# Altium integrated library Self made library.IntLib: 370 symbols (part 1 of 3) (continued)
## APF27_OK (continued)
part C pins: MH_1 MH
part D pins: MH_2 MH
part E pins: MH_3 MH
part F pins: MH_4 MH

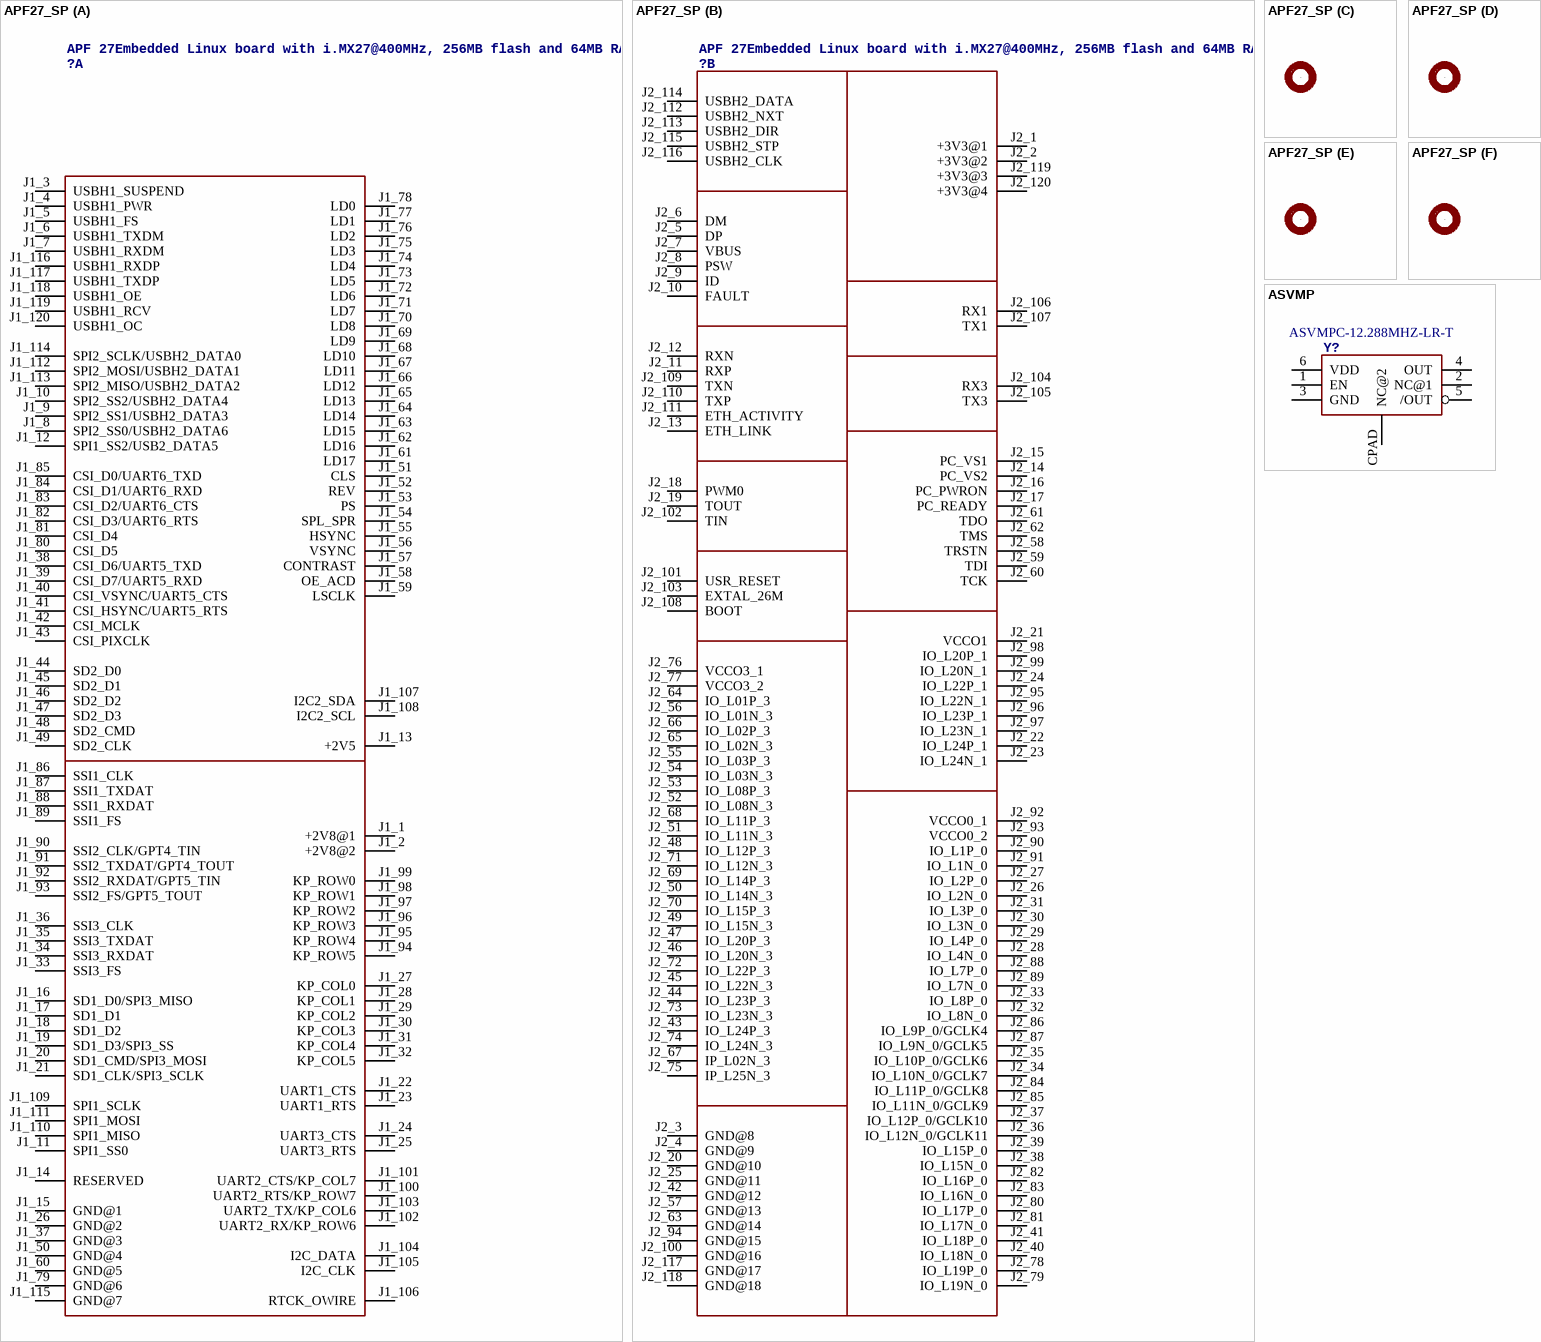
[diagram p4: symbols APF27_SP to ASVMP]

## APF27_SP
designator ?, comment APF 27Embedded Linux board with i.MX27@400MHz, 256MB flash and 64MB RAM
footprint APF27_SPECIAL_FOR_ADAPTER
part A pins: J1_1 +2V8@1, J1_2 +2V8@2, J1_3 USBH1_SUSPEND, J1_4 USBH1_PWR, J1_5 USBH1_FS, J1_6 USBH1_TXDM, J1_7 USBH1_RXDM, J1_8 SPI2_SS0/USBH2_DATA6, J1_9 SPI2_SS1/USBH2_DATA3, J1_10 SPI2_SS2/USBH2_DATA4, J1_11 SPI1_SS0, J1_12 SPI1_SS2/USB2_DATA5, J1_13 +2V5, J1_14 RESERVED, J1_15 GND@1, J1_16 SD1_D0/SPI3_MISO, J1_17 SD1_D1, J1_18 SD1_D2, J1_19 SD1_D3/SPI3_SS, J1_20 SD1_CMD/SPI3_MOSI, J1_21 SD1_CLK/SPI3_SCLK, J1_22 UART1_CTS, J1_23 UART1_RTS, J1_24 UART3_CTS, J1_25 UART3_RTS, J1_26 GND@2, J1_27 KP_COL0, J1_28 KP_COL1, J1_29 KP_COL2, J1_30 KP_COL3, J1_31 KP_COL4, J1_32 KP_COL5, J1_33 SSI3_FS, J1_34 SSI3_RXDAT, J1_35 SSI3_TXDAT, J1_36 SSI3_CLK, J1_37 GND@3, J1_38 CSI_D6/UART5_TXD, J1_39 CSI_D7/UART5_RXD, J1_40 CSI_VSYNC/UART5_CTS, J1_41 CSI_HSYNC/UART5_RTS, J1_42 CSI_MCLK, J1_43 CSI_PIXCLK, J1_44 SD2_D0, J1_45 SD2_D1, J1_46 SD2_D2, J1_47 SD2_D3, J1_48 SD2_CMD, J1_49 SD2_CLK, J1_50 GND@4, J1_51 CLS, J1_52 REV, J1_53 PS, J1_54 SPL_SPR, J1_55 HSYNC, J1_56 VSYNC, J1_57 CONTRAST, J1_58 OE_ACD, J1_59 LSCLK, J1_60 GND@5, J1_61 LD17, J1_62 LD16, J1_63 LD15, J1_64 LD14, J1_65 LD13, J1_66 LD12, J1_67 LD11, J1_68 LD10, J1_69 LD9, J1_70 LD8, J1_71 LD7, J1_72 LD6, J1_73 LD5, J1_74 LD4, J1_75 LD3, J1_76 LD2, J1_77 LD1, J1_78 LD0, J1_79 GND@6, J1_80 CSI_D5, J1_81 CSI_D4, J1_82 CSI_D3/UART6_RTS, J1_83 CSI_D2/UART6_CTS, J1_84 CSI_D1/UART6_RXD, J1_85 CSI_D0/UART6_TXD, J1_86 SSI1_CLK, J1_87 SSI1_TXDAT, J1_88 SSI1_RXDAT, J1_89 SSI1_FS, J1_90 SSI2_CLK/GPT4_TIN, J1_91 SSI2_TXDAT/GPT4_TOUT, J1_92 SSI2_RXDAT/GPT5_TIN, J1_93 SSI2_FS/GPT5_TOUT, J1_94 KP_ROW5, J1_95 KP_ROW4, J1_96 KP_ROW3, J1_97 KP_ROW2, J1_98 KP_ROW1, J1_99 KP_ROW0, J1_100 UART2_RTS/KP_ROW7, J1_101 UART2_CTS/KP_COL7, J1_102 UART2_RX/KP_ROW6, J1_103 UART2_TX/KP_COL6, J1_104 I2C_DATA, J1_105 I2C_CLK, J1_106 RTCK_OWIRE, J1_107 I2C2_SDA, J1_108 I2C2_SCL, J1_109 SPI1_SCLK, J1_110 SPI1_MISO, J1_111 SPI1_MOSI, J1_112 SPI2_MOSI/USBH2_DATA1, J1_113 SPI2_MISO/USBH2_DATA2, J1_114 SPI2_SCLK/USBH2_DATA0, J1_115 GND@7, J1_116 USBH1_RXDP, J1_117 USBH1_TXDP, J1_118 USBH1_OE, J1_119 USBH1_RCV, J1_120 USBH1_OC
part B pins: J2_1 +3V3@1, J2_2 +3V3@2, J2_3 GND@8, J2_4 GND@9, J2_5 DP, J2_6 DM, J2_7 VBUS, J2_8 PSW, J2_9 ID, J2_10 FAULT, J2_11 RXP, J2_12 RXN, J2_13 ETH_LINK, J2_14 PC_VS2, J2_15 PC_VS1, J2_16 PC_PWRON, J2_17 PC_READY, J2_18 PWM0, J2_19 TOUT, J2_20 GND@10, J2_21 VCCO1, J2_22 IO_L24P_1, J2_23 IO_L24N_1, J2_24 IO_L22P_1, J2_25 GND@11, J2_26 IO_L2N_0, J2_27 IO_L2P_0, J2_28 IO_L4N_0, J2_29 IO_L4P_0, J2_30 IO_L3N_0, J2_31 IO_L3P_0, J2_32 IO_L8N_0, J2_33 IO_L8P_0, J2_34 IO_L10N_0/GCLK7, J2_35 IO_L10P_0/GCLK6, J2_36 IO_L12N_0/GCLK11, J2_37 IO_L12P_0/GCLK10, J2_38 IO_L15N_0, J2_39 IO_L15P_0, J2_40 IO_L18N_0, J2_41 IO_L18P_0, J2_42 GND@12, J2_43 IO_L24P_3, J2_44 IO_L23P_3, J2_45 IO_L22N_3, J2_46 IO_L20N_3, J2_47 IO_L20P_3, J2_48 IO_L12P_3, J2_49 IO_L15N_3, J2_50 IO_L14N_3, J2_51 IO_L11N_3, J2_52 IO_L08N_3, J2_53 IO_L08P_3, J2_54 IO_L03N_3, J2_55 IO_L03P_3, J2_56 IO_L01N_3, J2_57 GND@13, J2_58 TRSTN, J2_59 TDI, J2_60 TCK, J2_61 TDO, J2_62 TMS, J2_63 GND@14, J2_64 IO_L01P_3, J2_65 IO_L02N_3, J2_66 IO_L02P_3, J2_67 IP_L02N_3, J2_68 IO_L11P_3, J2_69 IO_L14P_3, J2_70 IO_L15P_3, J2_71 IO_L12N_3, J2_72 IO_L22P_3, J2_73 IO_L23N_3, J2_74 IO_L24N_3, J2_75 IP_L25N_3, J2_76 VCCO3_1, J2_77 VCCO3_2, J2_78 IO_L19P_0, J2_79 IO_L19N_0, J2_80 IO_L17P_0, J2_81 IO_L17N_0, J2_82 IO_L16P_0, J2_83 IO_L16N_0, J2_84 IO_L11P_0/GCLK8, J2_85 IO_L11N_0/GCLK9, J2_86 IO_L9P_0/GCLK4, J2_87 IO_L9N_0/GCLK5, J2_88 IO_L7P_0, J2_89 IO_L7N_0, J2_90 IO_L1P_0, J2_91 IO_L1N_0, J2_92 VCCO0_1, J2_93 VCCO0_2, J2_94 GND@15, J2_95 IO_L22N_1, J2_96 IO_L23P_1, J2_97 IO_L23N_1, J2_98 IO_L20P_1, J2_99 IO_L20N_1, J2_100 GND@16, J2_101 USR_RESET, J2_102 TIN, J2_103 EXTAL_26M, J2_104 RX3, J2_105 TX3, J2_106 RX1, J2_107 TX1, J2_108 BOOT, J2_109 TXN, J2_110 TXP, J2_111 ETH_ACTIVITY, J2_112 USBH2_NXT, J2_113 USBH2_DIR, J2_114 USBH2_DATA, J2_115 USBH2_STP, J2_116 USBH2_CLK, J2_117 GND@17, J2_118 GND@18, J2_119 +3V3@3, J2_120 +3V3@4
part C pins: MH_1 MH
part D pins: MH_2 MH
part E pins: MH_3 MH
part F pins: MH_4 MH

## ASVMP
designator Y?, comment Manufacturer Part Number 1: ASVMPC-12.288MHZ-LR-T  (hidden comment: ABRACON - ASVMP Serie Oscillator   PERFORMANCE PLASTIC PACKAGE ULTRA MINIATURE PURE SILICONTM CLOCK OSCILLATOR)
UNIT_PRICE: 1.43; Description 1: Oscillateurs d'horloge standard 12.288MHz CMOS MEMS 25ppm -40C +85C; Fréquence: 12.288 MHz; Stabilité de fréquence: 25 PPM; Package/Boîte: 7 mm x 5 mm; Conditionnement: Reel; Produit: MEMS Oscillators; Tension d'alimentation: 2.25 V to 3.6 V; Style du raccordement: SMD/SMT; Température de fonctionnement max.: + 85 C; Température de fonctionnement min.: - 40 C; Format de sortie: CMOS; Quantité standard du lot: 1000; MANUFACTURER: ABRACON; MANUFACTURER_PART_NUMBER: ASVMPC-12.288MHZ-LR-T; SUPPLIER: Digikey; SUPPLIER_PART_NUMBER: 535-11178-6-ND; Supplier 1: Mouser; Supplier Part Number 1: 815-ASVMPC-12.28LR-T; Manufacturer 1: ABRACON; RoHS: RoHS Compliant; Category: Oscillateurs d'horloge standard; Stock 1: 0; Pricing 1: 1000=1.25, 2000=1.13, 5000=1.06, 10000=1.03 (CHF); Série: ASVMP; Marque: ABRACON; Style de montage: SMD/SMT; Fabricant: ABRACON; RoHS - Mouser: Y; Minimum Order Quantity: 1000; Reeling: True; ComponentLink1URL: http://www.mouser.com/ds/2/3/ASVMP-44479.pdf; ComponentLink1Description: http://www.mouser.com/ds/2/3/ASVMP-44479.pdf
footprint ASVMP
pins: 1 EN, 2 NC@1, 3 GND, 4 OUT, 5 /OUT, 6 VDD, CPAD NC@2

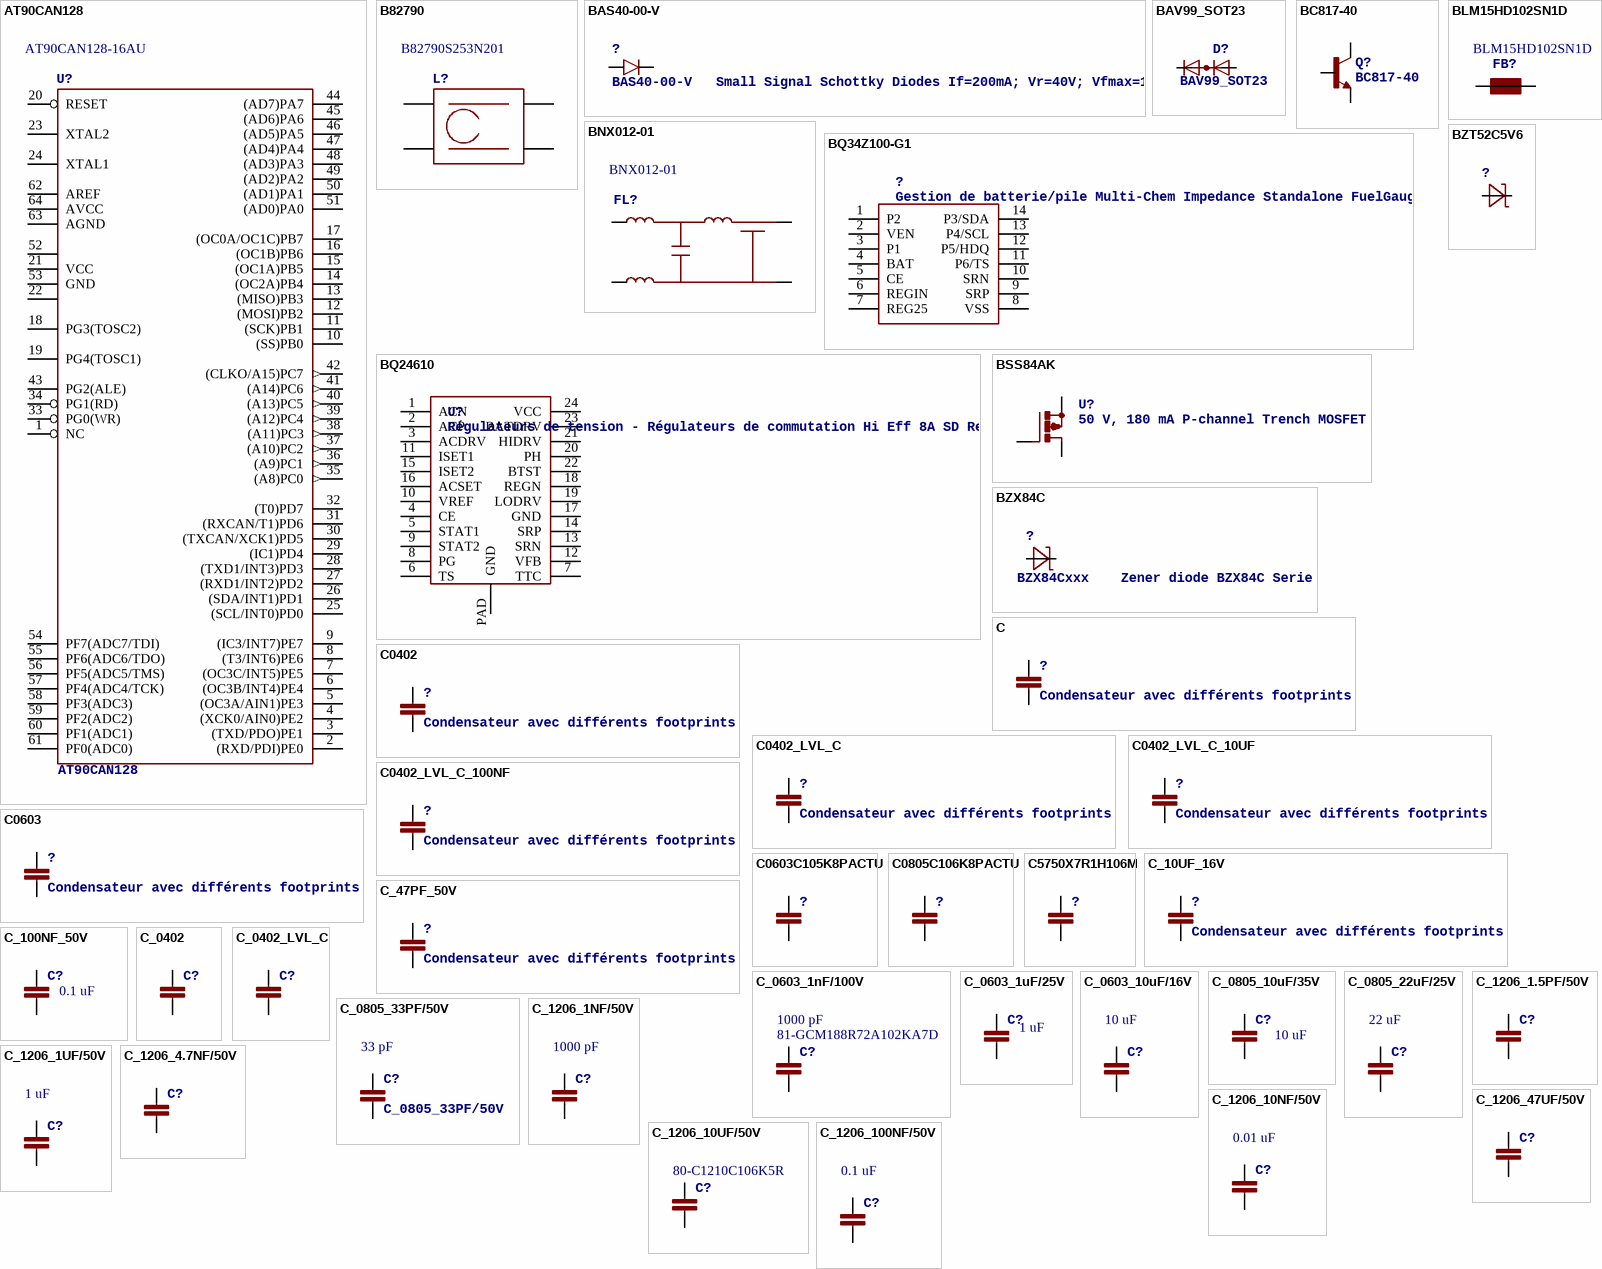
[diagram p5: symbols AT90CAN128 to C_1206_100NF/50V]

## AT90CAN128
designator U?  Manufacturer Part Number: AT90CAN128-16AU
8-bit Microcontroller with 128K Bytes of ISP Flash and CAN Controller; Manufacturer: Atmel; Data RAM Size: 4 kB; Interface Type: JTAG, SPI, TWI, USART; Number of I/Os: 53 I/O; Program Memory Size: 128 kB; Core: AVR; Data Bus Width: 8 bit; Maximum Clock Frequency: 16 MHz; Operating Supply Voltage: 2.7 V to 5.5 V; Processor Series: AT90CANx; Supply Voltage - Max: 5.5 V; Supply Voltage - Min: 2.7 V; Digger CMP: CMP3575; Supplier 1: Mouser; RoHS: RoHS Compliant; Category: 8-bit Microcontrollers - MCU; Stock 1: 5242; Pricing 1: 1=9.68, 10=8.81, 25=8.15, 50=7.80, 100=7.49, 250=6.83, 500=6.38, 1000=6.25 (CHF); Package/Case: TQFP-64; Program Memory Type: Flash; Series: AT90CAN128; Brand: Atmel; Mounting Style: SMD/SMT; Maximum Operating Temperature: + 85 C; Minimum Operating Temperature: - 40 C; Product Category: Microcontrollers - RISC; Standard Pack Qty: 450; RoHS - Mouser: Y; Minimum Order Quantity: 1; Reeling: False; ComponentLink1URL: http://www.mouser.com/ds/2/36/doc7679-50087.pdf; ComponentLink1Description: http://www.mouser.com/ds/2/36/doc7679-50087.pdf; Supplier Part Number 1: 556-A90CAN128-16AU
footprint TQFP64 (QFP, 64-Leads, Body 16,00x16,00mm, Pitch 0,8mm, IPC Medium Density)
pins: 1 NC, 2 (RXD/PDI)PE0, 3 (TXD/PDO)PE1, 4 (XCK0/AIN0)PE2, 5 (OC3A/AIN1)PE3, 6 (OC3B/INT4)PE4, 7 (OC3C/INT5)PE5, 8 (T3/INT6)PE6, 9 (IC3/INT7)PE7, 10 (SS)PB0, 11 (SCK)PB1, 12 (MOSI)PB2, 13 (MISO)PB3, 14 (OC2A)PB4, 15 (OC1A)PB5, 16 (OC1B)PB6, 17 (OC0A/OC1C)PB7, 18 PG3(TOSC2), 19 PG4(TOSC1), 20 RESET, 21 VCC (power), 22 GND1 (power), 23 XTAL2, 24 XTAL1, 25 (SCL/INT0)PD0, 26 (SDA/INT1)PD1, 27 (RXD1/INT2)PD2, 28 (TXD1/INT3)PD3, 29 (IC1)PD4, 30 (TXCAN/XCK1)PD5, 31 (RXCAN/T1)PD6, 32 (T0)PD7, 33 PG0(WR), 34 PG1(RD), 35 (A8)PC0 (out), 36 (A9)PC1 (out), 37 (A10)PC2 (out), 38 (A11)PC3 (out), 39 (A12)PC4 (out), 40 (A13)PC5 (out), 41 (A14)PC6 (out), 42 (CLKO/A15)PC7 (out), 43 PG2(ALE), 44 (AD7)PA7, 45 (AD6)PA6, 46 (AD5)PA5, 47 (AD4)PA4, 48 (AD3)PA3, 49 (AD2)PA2, 50 (AD1)PA1, 51 (AD0)PA0, 52 VCC1 (power), 53 GND (power), 54 PF7(ADC7/TDI), 55 PF6(ADC6/TDO), 56 PF5(ADC5/TMS), 57 PF4(ADC4/TCK), 58 PF3(ADC3), 59 PF2(ADC2), 60 PF1(ADC1), 61 PF0(ADC0), 62 AREF, 63 AGND, 64 AVCC

## B82790
designator L?  Manufacturer Part Number: B82790S253N201  (hidden comment: B82790)
Chokes for Data and Signal Lines; Manufacturer: EPCOS / TDK; Core Material: Ferrite; Inductance: 25 mH; Maximum DC Current: 500 mA; Maximum DC Resistance: 110 mOhms; Tolerance: 30 %; Type: Common Mode Choke, Ring Core; Case Height: 4.9 mm; Case Length: 9 mm; Case Width: 6 mm; Digger CMP: CMP3571; Supplier 1: Mouser; RoHS: RoHS Compliant; Category: Common Mode Filters / Chokes; Stock 1: 1398; Pricing 1: 1=3.66, 10=3.41, 100=2.42, 250=2.31, 500=2.21, 1000=1.59, 1500=1.59, 3000=1.55 (CHF); Packaging: Reel; Product: Chokes; Series: B82790S0; Termination Style: SMD/SMT; Brand: EPCOS / TDK; Standard Pack Qty: 1500; RoHS - Mouser: Y; Minimum Order Quantity: 1; Reeling: True; ComponentLink1URL: http://www.mouser.com/ds/2/400/b82790c0_s0-525376.pdf; ComponentLink1Description: http://www.mouser.com/ds/2/400/b82790c0_s0-525376.pdf; Supplier Part Number 1: 871-B82790S253N201
footprint B82790
pins: 1, 2, 3, 4

## BAS40-00-V
designator ?, comment BAS40-00-V   Small Signal Schottky Diodes If=200mA; Vr=40V; Vfmax=1V
footprint SOT23
pins: 1 A, 3 C

## BAV99_SOT23
designator D?
Manufacturer: Fairchild Semiconductor; Manufacturer Part Number: BAV99; Configuration: Dual Series; Forward Continuous Current: 0.2 A; Max Surge Current: 2 A; Recovery Time: 6 ns; Forward Voltage Drop: 1.25 V at 0.15 A; Digger CMP: CMP2481; Supplier 1: Mouser; RoHS: RoHS Compliant; Category: Diodes - General Purpose, Power, Switching; Stock 1: 119067; Pricing 1: 1=0.214, 10=0.145, 100=0.060, 1000=0.036, 3000=0.032, 9000=0.026, 24000=0.024, 45000=0.023, 99000=0.020 (CHF); Package/Case: SOT-23; Packaging: Reel; Series: BAV99; Brand: Fairchild Semiconductor; Mounting Style: SMD/SMT; Maximum Operating Temperature: + 150 C; Minimum Operating Temperature: - 55 C; Standard Pack Qty: 3000; RoHS - Mouser: Y; Minimum Order Quantity: 1; Reeling: True; ComponentLink1URL: http://www.mouser.com/ds/2/149/BAV99-22788.pdf; ComponentLink1Description: http://www.mouser.com/ds/2/149/BAV99-22788.pdf; Supplier Part Number 1: 512-BAV99
footprint SOT23
pins: 1 A, 2 C, 3 AC

## BC817-40
designator Q?
SMD npn small transistor; Manufacturer: Infineon Technologies; Manufacturer Part Number: BC 817K-40 E6327; Collector- Base Voltage VCBO: 50 V; Collector- Emitter Voltage VCEO Max: 45 V; Configuration: Single; Emitter- Base Voltage VEBO: 5 V; DC Collector/Base Gain hFE Min: 250; Gain Bandwidth Product fT: 170 MHz; Maximum DC Collector Current: 0.5 A; Maximum Power Dissipation: 500 mW; Digger CMP: CMP3884; Supplier 1: Mouser; RoHS: RoHS Compliant; Category: Bipolar Transistors - BJT; Stock 1: 125907; Pricing 1: 1=0.218, 10=0.189, 100=0.066, 1000=0.046, 3000=0.034, 9000=0.029, 24000=0.027, 45000=0.024, 99000=0.020 (CHF); Package/Case: SOT-23; Packaging: Reel; Series: BC 817K; Brand: Infineon Technologies; Mounting Style: SMD/SMT; Transistor Polarity: NPN; Maximum Operating Temperature: + 150 C; Minimum Operating Temperature: - 65 C; Product Category: General Purpose Transistors; Standard Pack Qty: 3000; RoHS - Mouser: Y; Minimum Order Quantity: 1; Reeling: True; ComponentLink1URL: http://www.mouser.com/ds/2/196/bc817Kseries_bc818Kseries-85224.pdf; ComponentLink1Description: http://www.mouser.com/ds/2/196/bc817Kseries_bc818Kseries-85224.pdf; Supplier Part Number 1: 726-BC817K-40E6327
footprint SOT23
pins: 1 B, 2 E, 3 C

## BLM15HD102SN1D
designator FB?, comment Manufacturer Part Number 1: BLM15HD102SN1D  (hidden comment: EMI filter)
MANUFACTURER: Murata Electronics; UNIT_PRICE: 0.163; Description 1: Perles de filtres, composants et faisceaux EMI 0402 1Kohms Tape GHz Hi Spd Sig Line; Impédance: 1 kOhms; Courant CC max.: 250 mA; Résistance CC max.: 1.25 Ohms; Plage de températures de fonctionnement: - 55 C to + 125 C; Package/Boîte: 0402 (1005 metric); Conditionnement: Reel; Produit: Ferrite Chip Beads; Série: BLM; Style du raccordement: SMD/SMT; Tolérance: 25 %; Hauteur du boîtier: 0.5 mm; Longueur du boîtier: 1 mm; Fabricant: Murata; Catégorie du produit: SMD EMI Filters/Chip Ferrite Beads; Quantité standard du lot: 10000; Fréquence de test: 100 MHz; MANUFACTURER_PART_NUMBER: BLM15HD102SN1D; SUPPLIER: mouser; SUPPLIER_PART_NUMBER: 81-BLM15HD102SN1D; Supplier 1: Mouser; Supplier Part Number 1: 81-BLM15HD102SN1D; Manufacturer 1: Murata Electronics; RoHS: RoHS Compliant; Category: Perles de filtres, composants et faisceaux EMI; Stock 1: 71076; Pricing 1: 1=0.229, 10=0.125, 100=0.086, 500=0.077, 1000=0.064, 2500=0.055, 10000=0.053, 20000=0.050, 50000=0.048 (CHF); Capacité électrique: -; Dimensions: 0.5 mm W x 1 mm L x 0.5 mm H; Marque: Murata Electronics; Largeur du boîtier: 0.5 mm; RoHS - Mouser: Y; Minimum Order Quantity: 1; Reeling: True; ComponentLink1URL: http://search.murata.co.jp/Ceramy/CatalogAction.do?sHinnm=?&nbsp&sNHinnm=BLM15HD102SN1D&sNhin_key=BLM15HD102SN1D&sLang=en; ComponentLink1Description: http://search.murata.co.jp/Ceramy/CatalogAction.do?sHinnm=?&nbsp&sNHinnm=BLM15HD102SN1D&sNhin_key=BLM15HD102SN1D&sLang=en
footprint R0402
pins: 1, 2

## BNX012-01
designator FL?, comment Manufacturer Part Number: BNX012-01  (hidden comment: Murata: BNX0 Series   Power Filter Block Type EMIFILr (LC Combined)  SMD-Type)
Manufacturer: Murata Electronics; Current Rating: 15 A; Frequency Range: 1 MHz to 1 GHz; Voltage Rating: 50 V; Circuit Type: LC Filter; Case Height: 8 mm; Case Length: 12 mm; Case Width: 11 mm; Digger CMP: CMP4454; Supplier 1: Mouser; RoHS: RoHS Compliant; Category: EMI Network Filter; Stock 1: 2542; Pricing 1: 1=4.36, 10=2.86, 100=2.52, 250=2.34, 500=2.23, 1000=2.17 (CHF); Capacitance: -; Inductance: -; Operating Temperature Range: - 55 C to + 125 C; Packaging: Bulk; Product: EMI Network Filter Arrays; Resistance: -; Series: BNX; Termination Style: Radial; Type: Block Type EMI Filter LC Combined; Brand: Murata Electronics; Cutoff Frequency: -; Product Category: Through Hole Suppression Filters; Standard Pack Qty: 150; Tradename: EMIFIL; RoHS - Mouser: Y; Minimum Order Quantity: 1; Reeling: False; ComponentLink1URL: http://www.mouser.com/ds/2/281/Murata BNX Series-303196.pdf; ComponentLink1Description: http://www.mouser.com/ds/2/281/Murata BNX Series-303196.pdf; Supplier Part Number 1: 81-BNX012-01
footprint BNX012-01
pins: B, CB, CGa, CGb, CGc, PSG

## BQ34Z100-G1
designator ?, comment Gestion de batterie/pile Multi-Chem Impedance Standalone FuelGauge
MANUFACTURER: Texas Instruments; MANUFACTURER_PART_NUMBER: BQ34Z100PW-G1; UNIT_PRICE: 6.1; SUPPLIER: Mouser; SUPPLIER_PART_NUMBER: 595-BQ34Z100PW-G1
footprint R-PDSO-G14
pins: 1 P2, 2 VEN, 3 P1, 4 BAT, 5 CE, 6 REGIN, 7 REG25, 8 VSS, 9 SRP, 10 SRN, 11 P6/TS, 12 P5/HDQ, 13 P4/SCL, 14 P3/SDA

## BQ24610
designator U?, comment Régulateurs de tension - Régulateurs de commutation Hi Eff 8A SD Reg
footprint S-PWGFN-N24
pins: 1 ACN, 2 ACP, 3 ACDRV, 4 CE, 5 STAT1, 6 TS, 7 TTC, 8 PG, 9 STAT2, 10 VREF, 11 ISET1, 12 VFB, 13 SRN, 14 SRP, 15 ISET2, 16 ACSET, 17 GND, 18 REGN, 19 LODRV, 20 PH, 21 HIDRV, 22 BTST, 23 BATDRV, 24 VCC, PAD GND

## BSS84AK
designator U?, comment 50 V, 180 mA P-channel Trench MOSFET
MANUFACTURER: NXP Semiconductors; MANUFACTURER_PART_NUMBER: BSS84AK,215; UNIT_PRICE: 0.098; SUPPLIER: mouser; SUPPLIER_PART_NUMBER: 771-BSS84AK215
footprint TO236
pins: 1 G, 2 S, 3 D

## BZT52C5V6
designator ?
MANUFACTURER: Vishay Semiconductors; UNIT_PRICE: 0.088; SUPPLIER: mouser; SUPPLIER_PART_NUMBER: BZT52C5V6-E3-08
footprint SOD123
pins: A, C

## BZX84C
designator ?, comment BZX84Cxxx    Zener diode BZX84C Serie
footprint SOT23
pins: 1 A, 3 C

## C
designator ?, comment Condensateur avec différents footprints
footprint 0805
pins: 1, 2

## C0402
designator ?, comment Condensateur avec différents footprints
footprint C0402
pins: 1, 2

## C0402_LVL_C
designator ?, comment Condensateur avec différents footprints
footprint C0402_LVL_C
pins: 1, 2

## C0402_LVL_C_10UF
designator ?, comment Condensateur avec différents footprints
MANUFACTURER: Murata; MANUFACTURER_PART_NUMBER: GRM155R60J106ME44D; UNIT_PRICE: 0.315; SUPPLIER: Mouser; SUPPLIER_PART_NUMBER: 81-GRM155R60J106ME4D
footprint C0402_LVL_C
pins: 1, 2

## C0402_LVL_C_100NF
designator ?, comment Condensateur avec différents footprints
MANUFACTURER: Murata; MANUFACTURER_PART_NUMBER: GRM155R61H104KE14D; UNIT_PRICE: 0.115; SUPPLIER: Mouser; SUPPLIER_PART_NUMBER: 81-GRM155R61H104KE4D
footprint C0402_LVL_C
pins: 1, 2

## C0603
designator ?, comment Condensateur avec différents footprints
footprint 0603
pins: 1, 2

## C0603C105K8PACTU
designator ?
footprint R0603
pins: 1, 2

## C0805C106K8PACTU
designator ?
footprint 0805
pins: 1, 2

## C5750X7R1H106M
designator ?
footprint C2220K
pins: 1, 2

## C_10UF_16V
designator ?, comment Condensateur avec différents footprints
MANUFACTURER: Murata; MANUFACTURER_PART_NUMBER: GRM188R61C106MAALD; UNIT_PRICE: 0.344; SUPPLIER: Mouser; SUPPLIER_PART_NUMBER: 81-GRM188R61C106MALD
footprint 0603
pins: 1, 2

## C_47PF_50V
designator ?, comment Condensateur avec différents footprints
MANUFACTURER: Vishay; MANUFACTURER_PART_NUMBER: VJ0603A470JXACW1BC; UNIT_PRICE: 0.057; SUPPLIER: Mouser; SUPPLIER_PART_NUMBER: 77-VJ0603A470JXACBC
footprint 0603
pins: 1, 2

## C_100NF_50V
designator C?, comment Capacité électrique: 0.1 uF  (hidden comment: Condensateur avec différents footprints)
MANUFACTURER: Murata; MANUFACTURER_PART_NUMBER: GCM188R71H104KA57D; Manufacturer 1: Murata Electronics; UNIT_PRICE: 0.127; Description 1: Condensateurs céramique multicouches MLCC - CMS 0603 0.1uF 50volts X7R 10%; Plage de températures de fonctionnement: - 55 C to + 125 C; Package/Boîte: 0603 (1608 metric); Conditionnement: Reel; Produit: Automotive MLCCs; Série: GCM; Style du raccordement: SMD/SMT; Tolérance: 10 %; Type: Automotive Ultra Small MLCC; Tension de voltage CC: 50 V; Code de caisse - po: 0603; Code de caisse - mm: 1608; Hauteur du boîtier: 0.8 mm; Longueur du boîtier: 1.6 mm; Diélectrique: X7R; Température de fonctionnement max.: + 125 C; Température de fonctionnement min.: - 55 C; Catégorie du produit: Automotive Ceramic Chip Capacitors; Quantité standard du lot: 4000; Coefficient/Code de température: +/- 15 %; SUPPLIER: Mouser; SUPPLIER_PART_NUMBER: 81-GCM188R71H104KA7D; Supplier 1: Mouser; Supplier Part Number 1: 81-GCM188R71H104KA7D; RoHS: RoHS Compliant; Category: Condensateurs céramique multicouches MLCC - CMS; Stock 1: 732259; Pricing 1: 1=0.126, 10=0.051, 100=0.029, 1000=0.025, 4000=0.019, 8000=0.017, 24000=0.016, 48000=0.013, 100000=0.012 (CHF); Marque: Murata Electronics; Largeur du boîtier: 0.8 mm; Fabricant: Murata; RoHS - Mouser: Y; Minimum Order Quantity: 1; Reeling: True; ComponentLink1URL: http://www.mouser.com/ds/2/281/c03e-516224.pdf; ComponentLink1Description: http://www.mouser.com/ds/2/281/c03e-516224.pdf; Manufacturer Part Number 1: GCM188R71H104KA57D
footprint 0603
pins: 1, 2

## C_0402
designator C?
footprint C0402
pins: 1, 2

## C_0402_LVL_C
designator C?
footprint C0402_LVL_C
pins: 1, 2

## C_0603_1nF/100V
designator C?  Capacitance: 1000 pF  Supplier Part Number 1: 81-GCM188R72A102KA7D  (hidden comment: C_0603_1nF/100V)
Manufacturer: Murata Electronics; Manufacturer Part Number: GCM188R72A102KA37D; Description: Multilayer Ceramic Capacitors MLCC - SMD/SMT 0603 1000pF 100volts X7R 10%; Tolerance: 10 %; Type: Automotive Ultra Small MLCC; Voltage Rating DC: 100 V; Case Height: 0.8 mm; Case Length: 1.6 mm; Dielectric: X7R; Supplier 1: Mouser; RoHS: RoHS Compliant; Category: Multilayer Ceramic Capacitors MLCC - SMD/SMT; Stock 1: 90106; Pricing 1: 1=0.105, 10=0.042, 100=0.025, 1000=0.019, 4000=0.015, 8000=0.013, 48000=0.011, 100000=0.009 (CHF); Package/Case: 0603 (1608 metric); Packaging: Reel; Product: Automotive MLCCs; Series: GCM; Termination Style: SMD/SMT; Brand: Murata Electronics; Case Code - in: 0603; Case Code - mm: 1608; Case Width: 0.8 mm; Maximum Operating Temperature: + 125 C; Minimum Operating Temperature: - 55 C; Product Category: Automotive Ceramic Chip Capacitors; Standard Pack Qty: 4000; RoHS - Mouser: Y; Minimum Order Quantity: 1; Reeling: True; ComponentLink1URL: http://www.mouser.com/ds/2/281/c03e-516224.pdf; ComponentLink1Description: http://www.mouser.com/ds/2/281/c03e-516224.pdf
footprint 0603
pins: 1, 2

## C_0603_1uF/25V
designator C?  Capacité électrique: 1 uF  (hidden comment: C_0603_1uF/25V)
Manufacturer 1: Murata Electronics; Manufacturer Part Number 1: GRM188R61E105KA12D; Description 1: Condensateurs céramique multicouches MLCC - CMS 0603 1uF 25volts X5R 10%; Plage de températures de fonctionnement: - 55 C to + 85 C; Package/Boîte: 0603 (1608 metric); Conditionnement: Reel; Produit: General Type MLCCs; Série: GRM; Style du raccordement: SMD/SMT; Tolérance: 10 %; Type: General Purpose MLCC; Tension de voltage CC: 25 V; Code de caisse - po: 0603; Code de caisse - mm: 1608; Hauteur du boîtier: 0.8 mm; Longueur du boîtier: 1.6 mm; Diélectrique: X5R; Fabricant: Murata; Température de fonctionnement max.: + 85 C; Température de fonctionnement min.: - 55 C; Catégorie du produit: High Capacitance SMD Ceramic Chip Capacitors; Quantité standard du lot: 4000; Coefficient/Code de température: +/- 15 %; Supplier 1: Mouser; Supplier Part Number 1: 81-GRM188R61E105KA12; RoHS: RoHS Compliant; Category: Condensateurs céramique multicouches MLCC - CMS; Stock 1: 450427; Pricing 1: 1=0.042, 10=0.027, 100=0.023, 1000=0.017, 4000=0.016, 8000=0.015, 24000=0.014, 48000=0.012 (CHF); Largeur du boîtier: 0.8 mm; RoHS - Mouser: Y; Minimum Order Quantity: 1; Reeling: True; ComponentLink1URL: http://www.mouser.com/ds/2/281/c02e-2905.pdf; ComponentLink1Description: http://www.mouser.com/ds/2/281/c02e-2905.pdf; Marque: Murata Electronics
footprint 0603
pins: 1, 2

## C_0603_10uF/16V
designator C?  Capacité électrique: 10 uF  (hidden comment: C_0603_10uF/16V)
Manufacturer 1: Murata Electronics; Manufacturer Part Number 1: GRM188R61C106MAALD; Description 1: Condensateurs céramique multicouches MLCC - CMS 0603 10uF 16volts X5R 20%; Conditionnement: Reel; Produit: General Type MLCCs; Série: GRM; Style du raccordement: SMD/SMT; Tolérance: 20 %; Type: General Purpose Ceramic Capacitors; Tension de voltage CC: 16 V; Code de caisse - po: 0603; Code de caisse - mm: 1608; Hauteur du boîtier: 0.8 mm; Longueur du boîtier: 1.6 mm; Classe: Class 2; Diélectrique: X5R; Fabricant: Murata; Température de fonctionnement max.: + 85 C; Température de fonctionnement min.: - 55 C; Coefficient/Code de température: +/- 15 %; Product Status: New Product; Supplier 1: Mouser; Supplier Part Number 1: 81-GRM188R61C106MALD; RoHS: RoHS Compliant; Category: Condensateurs céramique multicouches MLCC - CMS; Stock 1: 10378; Pricing 1: 1=0.374, 10=0.203, 100=0.122, 1000=0.109, 4000=0.076, 8000=0.074, 24000=0.071, 48000=0.066, 100000=0.062 (CHF); Marque: Murata Electronics; Largeur du boîtier: 0.8 mm; RoHS - Mouser: Y; Minimum Order Quantity: 1; Reeling: True; ComponentLink1URL: http://www.mouser.com/ds/2/281/c02e-2905.pdf; ComponentLink1Description: http://www.mouser.com/ds/2/281/c02e-2905.pdf
footprint 0603
pins: 1, 2

## C_0805_10uF/35V
designator C?  Capacitance: 10 uF  (hidden comment: C_0805_10uF/35V)
Manufacturer: Murata Electronics; Manufacturer Part Number: GRM21BR6YA106KE43L; Description: Multilayer Ceramic Capacitors MLCC - SMD/SMT 0805 10uF 35volts X5R + - 10%; Tolerance: 10 %; Type: General Purpose MLCC; Voltage Rating DC: 35 V; Case Height: 1.25 mm; Case Length: 2 mm; Dielectric: X5R; Product Status: New Product; Supplier 1: Mouser; RoHS: RoHS Compliant; Category: Multilayer Ceramic Capacitors MLCC - SMD/SMT; Stock 1: 5721; Pricing 1: 1=0.347, 10=0.190, 100=0.114, 1000=0.103, 3000=0.071, 9000=0.069, 24000=0.067, 45000=0.063, 99000=0.059 (CHF); Package/Case: 0805 (2012 metric); Packaging: Reel; Product: General Type MLCCs; Series: GRM; Termination Style: SMD/SMT; Brand: Murata Electronics; Case Code - in: 0805; Case Code - mm: 2012; Case Width: 1.25 mm; Maximum Operating Temperature: + 85 C; Minimum Operating Temperature: - 55 C; RoHS - Mouser: Y; Minimum Order Quantity: 1; Reeling: True; ComponentLink1URL: http://www.murata.com/products/catalog/pdf/c02e.pdf; ComponentLink1Description: http://www.murata.com/products/catalog/pdf/c02e.pdf; Supplier Part Number 1: 81-GRM21BR6YA106KE3L
footprint 0805
pins: 1, 2

## C_0805_22uF/25V
designator C?  Capacité électrique: 22 uF  (hidden comment: C_0805_22uF/25V)
Manufacturer 1: Murata Electronics; Manufacturer Part Number 1: GRM21BR61E226ME44L; Description 1: Condensateurs céramique multicouches MLCC - CMS 0805 22uF 25volts X5R 20%; Plage de températures de fonctionnement: - 55 C to + 85 C; Conditionnement: Reel; Produit: General Type MLCCs; Série: GRM; Style du raccordement: SMD/SMT; Tolérance: 20 %; Type: General Purpose Ceramic Capacitors; Tension de voltage CC: 25 V; Code de caisse - po: 0805; Code de caisse - mm: 2012; Hauteur du boîtier: 1.25 mm; Longueur du boîtier: 2 mm; Classe: Class 2; Diélectrique: X5R; Fabricant: Murata; Température de fonctionnement max.: + 85 C; Température de fonctionnement min.: - 55 C; Coefficient/Code de température: +/- 15 %; Product Status: New Product; Supplier 1: Mouser; Supplier Part Number 1: 81-GRM21BR61E226ME4L; RoHS: RoHS Compliant; Category: Condensateurs céramique multicouches MLCC - CMS; Stock 1: 23623; Pricing 1: 1=0.592, 10=0.319, 100=0.191, 1000=0.172, 3000=0.114, 9000=0.110, 24000=0.107, 45000=0.100, 99000=0.092 (CHF); Marque: Murata Electronics; Largeur du boîtier: 1.25 mm; RoHS - Mouser: Y; Minimum Order Quantity: 1; Reeling: True; ComponentLink1URL: http://www.mouser.com/ds/2/281/c02e-2905.pdf; ComponentLink1Description: http://www.mouser.com/ds/2/281/c02e-2905.pdf
footprint 0805
pins: 1, 2

## C_0805_33PF/50V
designator C?  Capacitance: 33 pF
Manufacturer: Kemet; Manufacturer Part Number: C0805C330J5GACTU; Tolerance: 5 %; Type: SMD MLCC C0G 10 - 250 VDC Commercial Grade; Voltage Rating DC: 50 V; Case Length: 2 mm; Case Width: 1.2 mm; Class: Class 1; Dielectric: C0G (NP0); Digger CMP: CMP3559; Supplier 1: Mouser; RoHS: RoHS Compliant; Category: Multilayer Ceramic Capacitors MLCC - SMD/SMT; Stock 1: 43415; Pricing 1: 1=0.100, 10=0.029, 100=0.017, 1000=0.014, 4000=0.011, 8000=0.009, 24000=0.008, 48000=0.007 (CHF); Package/Case: 0805 (2012 metric); Packaging: Reel; Product: General Type MLCCs; Series: C0805C; Termination Style: SMD/SMT; Voltage Rating AC: -; Brand: Kemet; Case Code - in: 0805; Case Code - mm: 2012; Case Height: -; Maximum Operating Temperature: + 125 C; Minimum Operating Temperature: - 55 C; Product Category: 0805 SMD Ceramic Chip Capacitors; Standard Pack Qty: 4000; RoHS - Mouser: Y; Minimum Order Quantity: 1; Reeling: True; ComponentLink1URL: http://www.kemet.com/Lists/ProductCatalog/Attachments/46/KEM_C1003_C0G_SMD.pdf; ComponentLink1Description: http://www.kemet.com/Lists/ProductCatalog/Attachments/46/KEM_C1003_C0G_SMD.pdf; Supplier Part Number 1: 80-C0805C330J5G
footprint 0805
pins: 1, 2

## C_1206_1.5PF/50V
designator C?
footprint 1206_capacitor
pins: 1, 2

## C_1206_1NF/50V
designator C?  Capacitance: 1000 pF  (hidden comment: C_1206_1NF/50V)
Manufacturer: Kemet; Manufacturer Part Number: C1206C102K5RACTU; Tolerance: 10 %; Type: SMD MLCC X7R 6.3 - 250 VDC Commerical Grade; Voltage Rating DC: 50 VDC; Case Length: 3.2 mm; Case Width: 1.6 mm; Class: Class 2; Dielectric: X7R; Digger CMP: CMP3563; Supplier 1: Mouser; RoHS: RoHS Compliant; Category: Multilayer Ceramic Capacitors MLCC - SMD/SMT; Stock 1: 26823; Pricing 1: 1=0.170, 10=0.068, 100=0.045, 1000=0.033, 4000=0.025, 8000=0.022, 24000=0.021, 48000=0.020, 100000=0.016 (CHF); Package/Case: 1206 (3216 metric); Packaging: Reel; Product: General Type MLCCs; Series: C1206C; Termination Style: SMD/SMT; Voltage Rating AC: -; Brand: Kemet; Case Code - in: 1206; Case Code - mm: 3216; Case Height: -; Maximum Operating Temperature: + 125 C; Minimum Operating Temperature: - 55 C; Product Category: 1206 SMD Ceramic Chip Capacitors; Standard Pack Qty: 4000; RoHS - Mouser: Y; Minimum Order Quantity: 1; Reeling: True; ComponentLink1URL: http://www.mouser.com/ds/2/212/KEM_C1002_X7R_SMD-357932.pdf; ComponentLink1Description: http://www.mouser.com/ds/2/212/KEM_C1002_X7R_SMD-357932.pdf; Supplier Part Number 1: 80-C1206C102K5R
footprint 1206_capacitor
pins: 1, 2

## C_1206_1UF/50V
designator C?  Capacitance: 1 uF  (hidden comment: C_1206_1UF/50V)
Manufacturer: Kemet; Manufacturer Part Number: C1206C105K5RACTU; Tolerance: 10 %; Type: SMD MLCC X7R 6.3 - 250 VDC Commerical Grade; Voltage Rating DC: 50 VDC; Case Length: 3.2 mm; Case Width: 1.6 mm; Class: Class 2; Dielectric: X7R; Digger CMP: CMP3556; Supplier 1: Mouser; RoHS: RoHS Compliant; Category: Multilayer Ceramic Capacitors MLCC - SMD/SMT; Stock 1: 296545; Pricing 1: 1=0.279, 10=0.114, 100=0.069, 1000=0.058, 2500=0.046, 10000=0.041, 25000=0.039, 100000=0.030 (CHF); Package/Case: 1206 (3216 metric); Packaging: Reel; Product: General Type MLCCs; Series: C1206C; Termination Style: SMD/SMT; Voltage Rating AC: -; Brand: Kemet; Case Code - in: 1206; Case Code - mm: 3216; Case Height: -; Maximum Operating Temperature: + 125 C; Minimum Operating Temperature: - 55 C; Product Category: High Capacitance SMD Ceramic Chip Capacitors; Standard Pack Qty: 2500; RoHS - Mouser: Y; Minimum Order Quantity: 1; Reeling: True; ComponentLink1URL: http://www.mouser.com/ds/2/212/KEM_C1002_X7R_SMD-357932.pdf; ComponentLink1Description: http://www.mouser.com/ds/2/212/KEM_C1002_X7R_SMD-357932.pdf; Supplier Part Number 1: 80-C1206C105K5R
footprint 1206_capacitor
pins: 1, 2

## C_1206_4.7NF/50V
designator C?
footprint 1206_capacitor
pins: 1, 2

## C_1206_10NF/50V
designator C?  Capacitance: 0.01 uF  (hidden comment: C_1206_10NF/50V)
Manufacturer: Kemet; Manufacturer Part Number: C1206C103K5RAC; Tolerance: 10 %; Type: SMD MLCC X7R 6.3 - 250 VDC Commerical Grade; Voltage Rating DC: 50 VDC; Case Length: 3.2 mm; Case Width: 1.6 mm; Class: Class 2; Dielectric: X7R; Digger CMP: CMP3564; Supplier 1: Mouser; RoHS: RoHS Compliant; Category: Multilayer Ceramic Capacitors MLCC - SMD/SMT; Stock 1: 34037; Pricing 1: 1=0.180, 10=0.072, 100=0.042, 1000=0.035, 4000=0.027, 8000=0.023, 24000=0.019, 48000=0.018, 100000=0.014 (CHF); Package/Case: 1206 (3216 metric); Packaging: Reel; Product: General Type MLCCs; Series: C1206C; Termination Style: SMD/SMT; Voltage Rating AC: -; Brand: Kemet; Case Code - in: 1206; Case Code - mm: 3216; Case Height: -; Maximum Operating Temperature: + 125 C; Minimum Operating Temperature: - 55 C; Product Category: 1206 SMD Ceramic Chip Capacitors; Standard Pack Qty: 4000; RoHS - Mouser: Y; Minimum Order Quantity: 1; Reeling: True; ComponentLink1URL: http://www.mouser.com/ds/2/212/KEM_C1002_X7R_SMD-357932.pdf; ComponentLink1Description: http://www.mouser.com/ds/2/212/KEM_C1002_X7R_SMD-357932.pdf; Supplier Part Number 1: 80-C1206C103K5RAC
footprint 1206_capacitor
pins: 1, 2

## C_1206_10UF/50V
designator C?  Supplier Part Number 1: 80-C1210C106K5R  (hidden comment: C_1206_10UF/50V)
Manufacturer: Kemet; Manufacturer Part Number: C1210C106K5RACTU; Capacitance: 10 uF; Tolerance: 10 %; Type: SMD MLCC X7R 6.3 - 250 VDC Commerical Grade; Voltage Rating DC: 50 VDC; Case Length: 3.2 mm; Case Width: 2.5 mm; Class: Class 2; Dielectric: X7R; Product Status: New at Mouser; Digger CMP: CMP4434; Supplier 1: Mouser; RoHS: RoHS Compliant; Category: Multilayer Ceramic Capacitors MLCC - SMD/SMT; Stock 1: 35098; Pricing 1: 1=1.17, 10=0.795, 100=0.470, 1000=0.324, 2000=0.288, 10000=0.277, 25000=0.267 (CHF); Package/Case: 1210 (3225 metric); Packaging: Reel; Product: General Type MLCCs; Series: C1210C; Termination Style: SMD/SMT; Voltage Rating AC: -; Brand: Kemet; Case Code - in: 1210; Case Code - mm: 3225; Case Height: -; Maximum Operating Temperature: + 125 C; Minimum Operating Temperature: - 55 C; RoHS - Mouser: Y; Minimum Order Quantity: 1; Reeling: True; ComponentLink1URL: http://www.mouser.com/ds/2/212/KEM_C1006_X5R_SMD-348855.pdf; ComponentLink1Description: http://www.mouser.com/ds/2/212/KEM_C1006_X5R_SMD-348855.pdf
footprint 1206_capacitor
pins: 1, 2

## C_1206_47UF/50V
designator C?
footprint 1206_capacitor
pins: 1, 2

## C_1206_100NF/50V
designator C?  Capacitance: 0.1 uF  (hidden comment: C_1206_100NF/50V)
Manufacturer: Kemet; Manufacturer Part Number: C1206C104K5RACTU; Tolerance: 10 %; Type: SMD MLCC X7R 6.3 - 250 VDC Commerical Grade; Voltage Rating DC: 50 VDC; Case Length: 3.2 mm; Case Width: 1.6 mm; Class: Class 2; Dielectric: X7R; Digger CMP: CMP3560; Supplier 1: Mouser; RoHS: RoHS Compliant; Category: Multilayer Ceramic Capacitors MLCC - SMD/SMT; Stock 1: 421284; Pricing 1: 1=0.100, 10=0.040, 100=0.026, 1000=0.018, 4000=0.014, 8000=0.012, 24000=0.011, 100000=0.008 (CHF); Package/Case: 1206 (3216 metric); Packaging: Reel; Product: General Type MLCCs; Series: C1206C; Termination Style: SMD/SMT; Voltage Rating AC: -; Brand: Kemet; Case Code - in: 1206; Case Code - mm: 3216; Case Height: -; Maximum Operating Temperature: + 125 C; Minimum Operating Temperature: - 55 C; Product Category: 1206 SMD Ceramic Chip Capacitors; Standard Pack Qty: 4000; RoHS - Mouser: Y; Minimum Order Quantity: 1; Reeling: True; ComponentLink1URL: http://www.mouser.com/ds/2/212/KEM_C1002_X7R_SMD-357932.pdf; ComponentLink1Description: http://www.mouser.com/ds/2/212/KEM_C1002_X7R_SMD-357932.pdf; Supplier Part Number 1: 80-C1206C104K5R
footprint 1206
pins: 1, 2
